# Altium footprint library 电阻封装库.PcbLib: 218 footprints (part 11 of 14)
Each footprint in its own frame and in the unit in brackets; x right, y up, seen from the top. Pads: shape width x height; smd on the part's side, far side on the other; paste and mask are expansions set on the pad; w line width, h text height; cw(c..) or ccw(c..) is an arc to the next point about the centre after c.
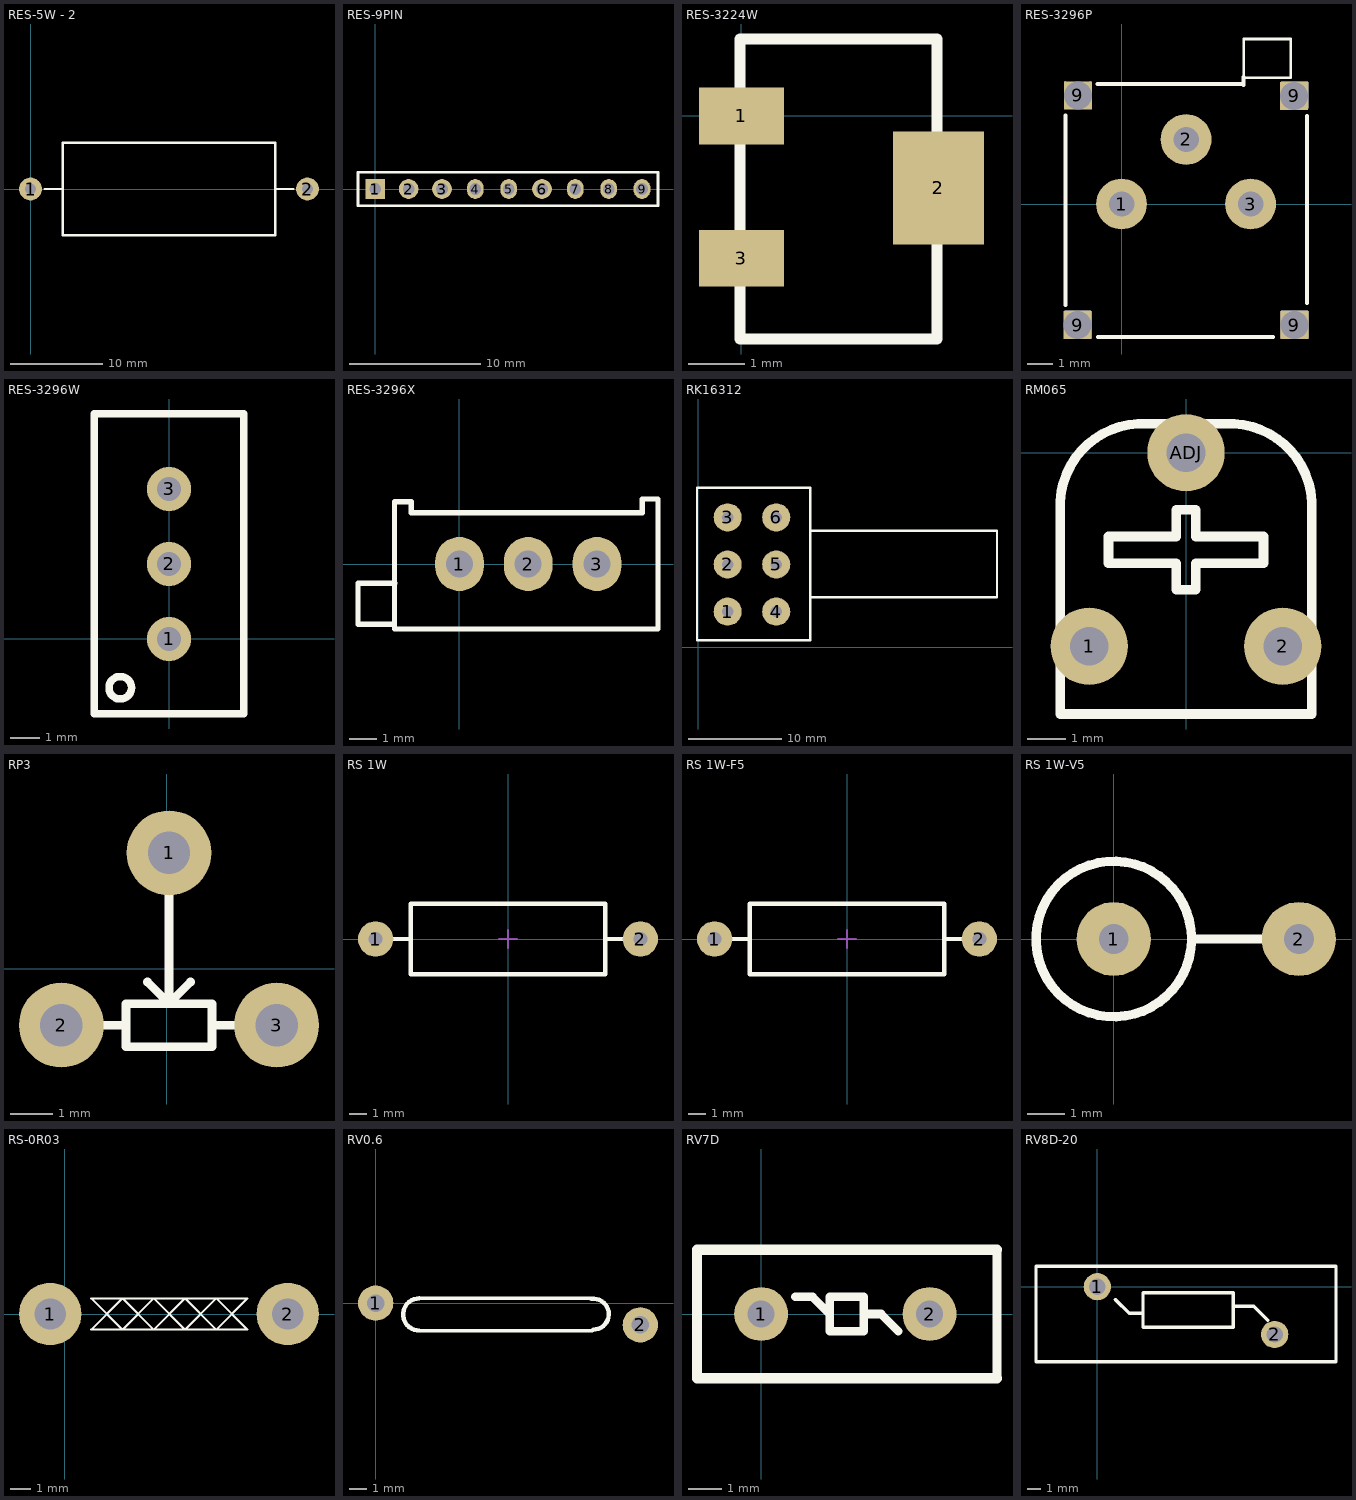
[diagram p10: the footprints below, top view; thin cyan lines are the x and y axes]

## RES-5W - 2 [mm]
pads (2):
  round 2.5 hole 1.2: 1(0,0) 2(30,0)
Top Overlay:
  lines w0.254: 1.524,0 3.5,0 ; 26.5,0 28.448,0 ; 3.5,-5 26.5,-5 26.5,5 3.5,5 3.5,-5

## RES-9PIN [mm]
pads (9):
  rect 1.5x1.5 hole 0.9: 1(0,0)
  round 1.5 hole 0.9: 2(2.54,0) 3(5.08,0) 6(12.7,0)
  oval 1.27x1.5 hole 0.9: 4(7.62,0) 5(10.16,0) 7(15.24,0) 8(17.78,0) 9(20.32,0)
Top Overlay:
  lines w0.2: -1.321,-1.27 21.539,-1.27 21.539,1.27 -1.321,1.27 -1.321,-1.27

## RES-3224W [mm]
pads (3):
  rect 1.5x1 smd: 1(0,0) 3(0,-2.515)
  rect 1.6x2 smd: 2(3.48,-1.27)
Top Overlay:
  lines w0.2: -0.025,-3.937 3.454,-3.937 3.454,1.359 -0.025,1.359 -0.025,-3.937
Mechanical 2:
  text "+" at 1.194,-0.953 h0.76

## RES-3296P [mm]
pads (7):
  round 2 hole 1: 1(0,0) 2(2.54,2.54) 3(5.08,0)
  rect 1.1x1.1 hole 1.1: 9(-1.727,-4.764) 9(-1.722,4.272) 9(6.794,4.255) 9(6.801,-4.764)
Top Overlay:
  lines w0.1: -2.225,4.763 -2.225,3.783 -1.225,3.783 -1.225,4.763 ; 4.811,4.975 5.811,4.975 ; -2.225,-5.267 -2.225,-4.247 -1.225,-4.247 -1.225,-5.267 -2.225,-5.267 ; 4.804,4.975 4.804,6.495 6.668,6.495 6.668,4.975 4.804,4.975 ; 6.305,-5.267 6.305,-4.247 7.305,-4.247 7.305,-5.267 6.305,-5.267 ; 6.305,3.783 6.305,4.763 7.305,4.763 7.305,3.783 6.305,3.783
  lines w0.152: -2.207,-3.983 -2.207,3.486 ; -0.946,4.726 4.791,4.726 ; -0.924,-5.236 5.973,-5.236 ; 4.798,4.692 4.798,5.001 ; 7.303,-3.906 7.303,3.47
Mechanical 11:
  circle w0.1: c2.54,2.503 r0.25
  circle w0.1: c5.08,-0.037 r0.25
  circle w0.1: c0,-0.037 r0.25

## RES-3296W [mm]
pads (3):
  round 1.5 hole 0.8: 1(0,0) 2(0,2.54) 3(0,5.08)
Top Overlay:
  circle w0.254: c-1.651,-1.651 r0.381
  lines w0.254: -2.54,-2.54 2.54,-2.54 2.54,7.62 -2.54,7.62 -2.54,-2.54

## RES-3296X [mm]
pads (3):
  oval 1.8x2 hole 1: 1(0,0) 2(2.54,0) 3(5.08,0)
Top Overlay:
  lines w0.2: -2.469,-2.233 -3.748,-2.233 -3.748,-0.717 -2.398,-0.717 ; -2.4,-2.4 -1.26,-2.4 6.34,-2.4 7.337,-2.4 7.337,2.4 6.749,2.4 6.749,1.9 5.38,1.9 4.78,1.9 2.84,1.9 2.24,1.9 0.3,1.9 -0.3,1.9 -1.777,1.9 -1.777,2.3 -2.4,2.3 -2.4,-2.4
Mechanical 11:
  circle w0.1: c5.08,0.01 r0.25
  circle w0.1: c2.54,0.01 r0.25
  circle w0.1: c0,0.01 r0.25

## RK16312 [mm]
pads (6):
  round 3 hole 1.2: 1(3.15,3.81) 2(3.15,8.839) 3(3.15,13.868) 4(8.331,3.81) 5(8.331,8.839) 6(8.331,13.868)
Top Overlay:
  lines w0.254: 11.963,12.421 31.902,12.421 31.902,5.334 11.989,5.334 ; -0.127,0.762 -0.127,17.018 11.963,17.018 11.963,0.762 -0.127,0.762
3D body "RK16312-L20.STEP": height 20.62, standoff -4, extent -0.124,-0.035 31.976,17.065

## RM065 [mil] "蓝白可调电位器"
pads (3):
  round 80 hole 39.37: 1(-100,-200)
  round 80 hole 40: 2(100,-200) ADJ(0,0)
Top Overlay:
  lines w10: -120,-220 -109.45,-209.45 ; -130,-270 130,-270 130,-50 ccw(c45,-55) 40,30 -40,30 ccw(c-45,-55) -130,-50 -130,-270 ; -80,-114.17 -80,-86.61 -10,-86.61 -10,-70 -10,-59.06 10,-59.06 10,-86.61 80,-86.61 80,-114.17 10,-114.17 10,-141.73 -10,-141.73 -10,-114.17 -80,-114.17
3D body "RM065.STEP": height 299.21, standoff -137.8, extent -127.95,-268.83 127.96,29.59

## RP3 [mm]
pads (3):
  round 2 hole 1: 1(0.052,2.739) 2(-2.488,-1.325) 3(2.592,-1.325)
Top Overlay:
  lines w0.203: -2.488,-1.325 -0.964,-1.325 ; -0.456,-0.309 0.052,-0.817 ; 0.052,2.739 0.052,-0.817 ; 0.56,-0.309 0.052,-0.817 ; 1.068,-1.325 2.592,-1.325 ; -0.964,-1.325 -0.964,-1.833 1.068,-1.833 1.068,-0.817 -0.964,-0.817 -0.964,-1.325

## RS 1W [mm] "直插色环电阻，脚距15mm，直径4mm"
pads (2):
  round 2 hole 0.8: 1(-7.5,0) 2(7.5,0)
Top Overlay:
  lines w0.254: -6.5,0 -5.5,0 ; 5.5,0 6.5,0 ; -5.5,-2 5.5,-2 5.5,2 -5.5,2 -5.5,-2
Mechanical 15:
  lines w0.1: -0.508,0 0.508,0 ; 0,-0.508 0,0.508
3D body "RS 1W.STEP": height 4.11, standoff -3.4, extent -7.8,-2.01 7.8,2.01

## RS 1W-F5 [mm] "直插色环电阻，脚距15mm，直径4mm，浮空5mm"
pads (2):
  round 2 hole 0.8: 1(-7.5,0) 2(7.5,0)
Top Overlay:
  lines w0.254: -6.5,0 -5.5,0 ; 5.5,0 6.5,0 ; -5.5,-2 5.5,-2 5.5,2 -5.5,2 -5.5,-2
Mechanical 15:
  lines w0.1: -0.508,0 0.508,0 ; 0,-0.508 0,0.508
3D body "RS 1W-F5.STEP": height 9.01, standoff -3.5, extent -7.8,-2.01 7.8,2.01

## RS 1W-V5 [mm] "直插色环电阻，脚距5mm，直径4mm"
pads (2):
  round 2 hole 0.8: 1(0,0) 2(5,0)
Top Overlay:
  circle w0.254: c0,0 r2.1
  lines w0.254: 2.1,0 4.2,0
3D body "RS 1W-V5.STEP": height 13.3, standoff -3.5, extent -2.01,-2.01 5.3,2.01

## RS-0R03 [mm]
pads (2):
  round 3 hole 1.5: 1(-0.7,0) 2(10.7,0)
Top Overlay:
  lines w0.1: 1.268,-0.75 8.768,-0.75 7.268,0.75 5.768,-0.75 4.268,0.75 2.768,-0.75 1.268,0.75 8.768,0.75 7.268,-0.75 5.768,0.75 4.268,-0.75 2.768,0.75 1.268,-0.75
3D body "User Library-615HR030E.step": height 6.5, standoff -2, extent -1.6,-1.2 11.6,1.2

## RV0.6 [mil]
pads (2):
  round 80 hole 40: 1(0,0) 2(598.42,-49.21)
Top Overlay:
  lines w7.87: 98.42,-61.97 490.19,-61.97 ; 98.42,10.83 486.65,10.83
  lines w10: 98.42,-61.98 cw(c98.42,-25.57) 98.42,10.83 ; 487.78,9.69 cw(c492.13,-25.04) 492.13,-60.04

## RV7D [mm]
pads (2):
  round 1.6 hole 0.8: 1(0,0) 2(5,0)
Top Overlay:
  lines w0.254: 1.016,0.508 1.524,0.508 2.032,0 ; 3.048,0 3.556,0 4.064,-0.508 ; 7,-1.905 7,1.905 ; 2.032,-0.508 2.032,0.508 3.048,0.508 3.048,-0.508 2.032,-0.508
  lines w0.305: 7,-1.905 -1.905,-1.905 -1.905,1.905 7,1.905
3D body "Vishay Intertechnology-VDRS07H420BSE Vishay-DEFAULT.STEP": height 12.5, standoff -22.5, extent -1.833,-3.984 7.167,1.016

## RV8D-20 [mm]
pads (2):
  round 2 hole 1.2: 1(0,0) 2(13,-3.5)
Top Overlay:
  lines w0.254: 1.316,-0.936 2.332,-1.952 3.348,-1.952 ; 9.952,-1.444 11.476,-1.444 12.492,-2.46 ; -2.54,-5.5 -4.5,-5.5 -4.5,1.5 -2.54,1.5 15.54,1.5 17.5,1.5 17.5,-5.5 15.54,-5.5 -2.54,-5.5 ; -2.54,-5.5 -2.54,-5.5 ; 3.348,-2.968 9.952,-2.968 9.952,-0.428 3.348,-0.428 3.348,-2.968
3D body "SW3dPS-MOV, 130V, 20MM, 15KA, STRAIGHT LEAD, WPI VZ20E201KBSX-VBN.STEP": height 24.75, standoff -4, extent -3.65,-3.048 16.35,0.452